# Altium footprint library Passives-SMD_L.PCBLIB: 16 footprints
Each footprint in its own frame and in the unit in brackets; x right, y up, seen from the top. Pads: shape width x height; smd on the part's side, far side on the other; paste and mask are expansions set on the pad; w line width, h text height; cw(c..) or ccw(c..) is an arc to the next point about the centre after c.
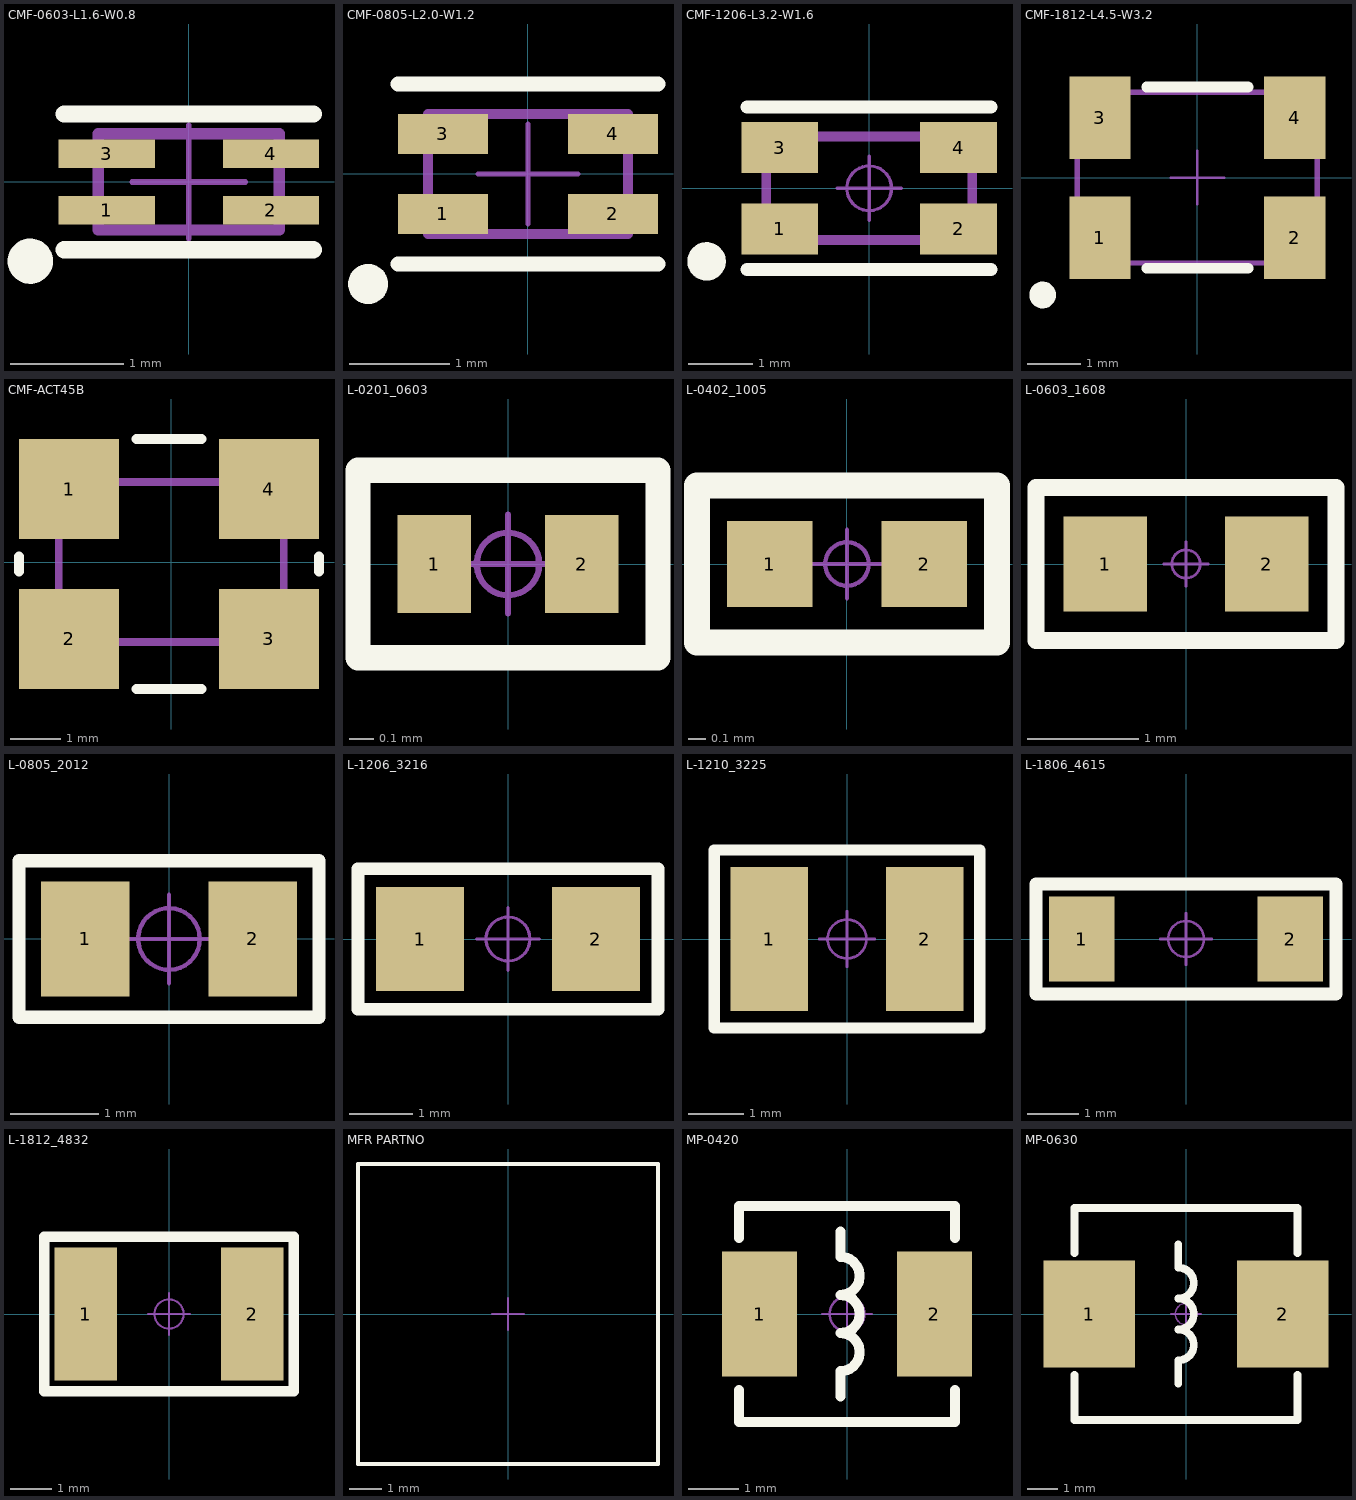
[diagram p0: the footprints below, top view; thin cyan lines are the x and y axes]

## CMF-0603-L1.6-W0.8 [mm] "SMT Common Mode Line Filter, 4-leads, body 1.6x0.85mm"
height 1.1
pads (4):
  rect 0.85x0.25 smd: 1(-0.725,-0.25) 2(0.725,-0.25) 3(-0.725,0.25) 4(0.725,0.25)
Top Overlay:
  circle w0.2: c-1.4,-0.7 r0.1
  lines w0.152: -1.1,-0.6 1.1,-0.6 ; -1.1,0.6 1.1,0.6
Top 元件外形:
  lines w0.1: -0.8,-0.425 -0.8,0.425 0.8,0.425 0.8,-0.425 -0.8,-0.425
Top 中心点:
  lines w0.05: -0.5,0 0.5,0 ; 0,-0.5 0,0.5
3D body "cmf_0603-2.stp": height 1.11, standoff 0.01, extent -0.8,-0.425 0.8,0.425

## CMF-0805-L2.0-W1.2 [mm] "SMT Common Mode Line Filter, 4-leads, body 2x1.2mm"
height 1.2
pads (4):
  rect 0.9x0.4 smd: 1(-0.85,-0.4) 2(0.85,-0.4) 3(-0.85,0.4) 4(0.85,0.4)
Top Overlay:
  circle w0.2: c-1.6,-1.1 r0.1
  lines w0.152: -1.3,-0.9 1.3,-0.9 ; -1.3,0.9 1.3,0.9
Top 元件外形:
  lines w0.1: -1,-0.6 -1,0.6 1,0.6 1,-0.6 -1,-0.6
Top 中心点:
  lines w0.05: -0.5,0 0.5,0 ; 0,-0.5 0,0.5
3D body "cmf_0805-2.stp": height 1.16, standoff -0.04, extent -1,-0.6 1,0.6

## CMF-1206-L3.2-W1.6 [mm] "SMT Common Mode Line Filter, 4-leads, body 3.2x1.6mm"
pads (4):
  rect 1.2x0.8 smd: 1(-1.397,-0.635) 2(1.397,-0.635) 3(-1.397,0.635) 4(1.397,0.635)
Top Overlay:
  circle w0.3: c-2.54,-1.143 r0.15
  lines w0.203: -1.905,-1.27 1.905,-1.27 ; -1.905,1.27 1.905,1.27
Top 元件外形:
  lines w0.152: -1.61,-0.81 1.61,-0.81 1.61,0.81 -1.61,0.81 -1.61,-0.81
Top 中心点:
  circle w0.05: c0,0 r0.35
  lines w0.05: -0.5,0 0.5,0 ; 0,-0.5 0,0.5
3D body "WCM3216-2.stp": height 2, standoff -0.01, extent -1.61,-0.81 1.61,0.81

## CMF-1812-L4.5-W3.2 [mm] "SMT Common Mode Line Filter, 4-leads, body 4.5x3.2mm"
height 2.8
pads (4):
  rect 1.15x1.55 smd: 1(-1.825,-1.125) 2(1.825,-1.125) 3(-1.825,1.125) 4(1.825,1.125)
Top Overlay:
  circle w0.25: c-2.9,-2.2 r0.125
  lines w0.2: -0.95,-1.7 0.95,-1.7 ; -0.95,1.7 0.95,1.7
Top 元件外形:
  lines w0.1: -2.25,-1.6 -2.25,1.6 2.25,1.6 2.25,-1.6 -2.25,-1.6
Top 中心点:
  lines w0.05: -0.5,0 0.5,0 ; 0,-0.5 0,0.5
3D body "cmf_1812.stp": height 2.87, standoff 0.01, extent -2.25,-1.6 2.25,1.6

## CMF-ACT45B [mm] "4.5x3.2mm"
height 10
pads (4):
  rect 2x2 smd: 1(-2.048,1.46) 2(-2.048,-1.54) 3(1.952,-1.54) 4(1.952,1.46)
Top Overlay:
  lines w0.2: -3.048,-0.188 -3.048,0.108 ; -0.696,-2.54 0.6,-2.54 ; -0.696,2.46 0.6,2.46 ; 2.952,-0.188 2.952,0.108
Top 元件外形:
  lines w0.152: -2.25,-1.6 -2.25,1.6 0,1.6 2.25,1.6 2.25,-1.6 -2.25,-1.6
3D body "cmf_1812.stp": height 2.87, standoff 0.01, extent -2.25,-1.6 2.25,1.6

## L-0201_0603 [mm]
pads (2):
  rect 0.3x0.4 smd: 1(-0.3,0) 2(0.3,0)
Top Overlay:
  lines w0.102: -0.61,-0.381 -0.61,0.381 0.61,0.381 0.61,-0.381 -0.61,-0.381
Top 中心点:
  circle w0.025: c0,0 r0.127
  lines w0.025: -0.2,0 0.2,0 ; 0,-0.2 0,0.2
3D body "L0201-B-2.stp": height 0.3, standoff 0, extent -0.3,-0.15 0.3,0.15

## L-0402_1005 [mm]
pads (2):
  rect 0.5x0.5 smd: 1(-0.45,0) 2(0.45,0)
Top Overlay:
  lines w0.152: -0.875,-0.457 -0.875,0.457 0.875,0.457 0.875,-0.457 -0.875,-0.457
Top 中心点:
  circle w0.025: c0,0 r0.127
  lines w0.025: -0.2,0 0.2,0 ; 0,-0.2 0,0.2
3D body "L0402-A2-2.stp": height 0.52, standoff 0, extent -0.51,-0.26 0.51,0.26

## L-0603_1608 [mm] "0603贴片叠层电感"
pads (2):
  rect 0.75x0.85 smd: 1(-0.725,0) 2(0.725,0)
Top Overlay:
  lines w0.152: -1.346,-0.686 1.346,-0.686 1.346,0.686 -1.346,0.686 -1.346,-0.686
Top 中心点:
  circle w0.025: c0,0 r0.127
  lines w0.025: -0.2,0 0.2,0 ; 0,-0.2 0,0.2
3D body "L0603H08-2S.stp": height 0.8, standoff 0, extent -0.8,-0.4 0.8,0.4

## L-0805_2012 [mm] "0805贴片叠层电感"
height 0.5
pads (2):
  rect 1x1.3 smd: 1(-0.95,0) 2(0.95,0)
Top Overlay:
  lines w0.152: -1.702,-0.889 1.702,-0.889 1.702,0.889 -1.702,0.889 -1.702,-0.889
Top 中心点:
  circle w0.05: c0,0 r0.35
  lines w0.05: -0.5,0 0.5,0 ; 0,-0.5 0,0.5
3D body "L0805H13-2S.stp": height 1.3, standoff 0, extent -1,-0.65 1,0.65

## L-1206_3216 [mm] "1206贴片叠层电感"
pads (2):
  rect 1.4x1.65 smd: 1(-1.4,0) 2(1.4,0)
Top Overlay:
  lines w0.203: -2.388,-1.118 -2.388,1.118 2.388,1.118 2.388,-1.118 -2.388,-1.118
Top 中心点:
  circle w0.05: c0,0 r0.35
  lines w0.05: -0.5,0 0.5,0 ; 0,-0.5 0,0.5
3D body "L1206-2S.stp": height 1.1, standoff 0, extent -1.6,-0.798 1.6,0.798

## L-1210_3225 [mm] "1210贴片叠层电感"
pads (2):
  rect 1.4x2.6 smd: 1(-1.4,0) 2(1.4,0)
Top Overlay:
  lines w0.203: -2.388,-1.6 -2.388,1.6 2.388,1.6 2.388,-1.6 -2.388,-1.6
Top 中心点:
  circle w0.05: c0,0 r0.35
  lines w0.05: -0.5,0 0.5,0 ; 0,-0.5 0,0.5
3D body "L1210-2S.stp": height 0.92, standoff 0.02, extent -1.6,-1.26 1.6,1.26

## L-1806_4615 [mil] "1806贴片叠层电感"
pads (2):
  rect 50x65 smd: 1(-80.01,-0.01) 2(80,0)
Top Overlay:
  lines w10: 65,42 115,42 115,-42 65,-42 -115,-42 -115,42 ; 75,42 -115,42 ; -115,42 -115,42
Top 中心点:
  circle w1.97: c0,0 r13.78
  lines w1.97: -19.68,0 19.68,0 ; 0,-19.68 0,19.68
3D body "L1806H16-2S.stp": height 62.99, standoff -0.08, extent -88.58,-31.49 88.58,31.5

## L-1812_4832 [mm] "1812贴片叠层电感"
pads (2):
  rect 1.5x3.2 smd: 1(-2,0) 2(2,0)
Top Overlay:
  lines w0.254: 1.143,-1.854 2.997,-1.854 2.997,1.854 1.27,1.854 -2.997,1.854 -2.997,-1.854 1.422,-1.854
Top 中心点:
  circle w0.05: c0,0 r0.35
  lines w0.05: -0.5,0 0.5,0 ; 0,-0.5 0,0.5
3D body "L1812H26-2S.stp": height 2.6, standoff 0, extent -2.25,-1.6 2.25,1.6

## MFR PARTNO [mm] "记得设置高度"
Top Overlay:
  lines w0.127: -4.7,-4.7 4.7,-4.7 4.7,4.7 -4.7,4.7 -4.7,-4.7
Top 元件外形:
  lines w0.127: -4.7,-4.7 -4.7,4.7 4.7,4.7 4.7,-4.7 -4.7,-4.7
Top 中心点:
  lines w0.051: -0.5,0 0.5,0 ; 0,-0.5 0,0.5

## MP-0420 [mm] "一体成型功率电感"
pads (2):
  rect 1.5x2.5 smd: 1(-1.75,0) 2(1.75,0)
Top Overlay:
  lines w0.203: -2.159,-1.524 -2.159,-2.159 2.159,-2.159 2.159,-1.524 ; -2.159,1.524 -2.159,2.159 2.159,2.159 2.159,1.524 ; -0.127,-1.651 -0.127,-1.143 ccw(c-0.127,-0.762) -0.127,-0.381 ccw(c-0.127,0) -0.127,0.381 ccw(c-0.127,0.762) -0.127,1.143 -0.127,1.651
Top 中心点:
  circle w0.05: c0,0 r0.35
  lines w0.05: -0.5,0 0.5,0 ; 0,-0.5 0,0.5
3D body "SMD-0420-5.stp": height -0.43, standoff -2.46, extent -2.25,-2.05 2.25,2.05

## MP-0630 [mm] "一体成型功率电感"
pads (2):
  rect 3x3.5 smd: 1(-3.175,0) 2(3.175,0)
Top Overlay:
  lines w0.254: -3.658,-2.007 -3.658,-3.48 3.658,-3.48 3.658,-2.007 ; -3.658,2.007 -3.658,3.48 3.658,3.48 3.658,2.007 ; -0.254,-2.286 -0.254,-1.524 ccw(c-0.254,-1.016) -0.254,-0.508 ccw(c-0.254,0) -0.254,0.508 ccw(c-0.254,1.016) -0.254,1.524 -0.254,2.286
Top 中心点:
  circle w0.05: c0,0 r0.35
  lines w0.05: -0.5,0 0.5,0 ; 0,-0.5 0,0.5
3D body "SMD-0630.stp": height -0.46, standoff -3.48, extent -3.475,-3.3 3.475,3.3